# Altium footprint library MyPcbLib.PcbLib: 657 footprints (part 31 of 42)
Each footprint in its own frame and in the unit in brackets; x right, y up, seen from the top. Pads: shape width x height; smd on the part's side, far side on the other; paste and mask are expansions set on the pad; w line width, h text height; cw(c..) or ccw(c..) is an arc to the next point about the centre after c.
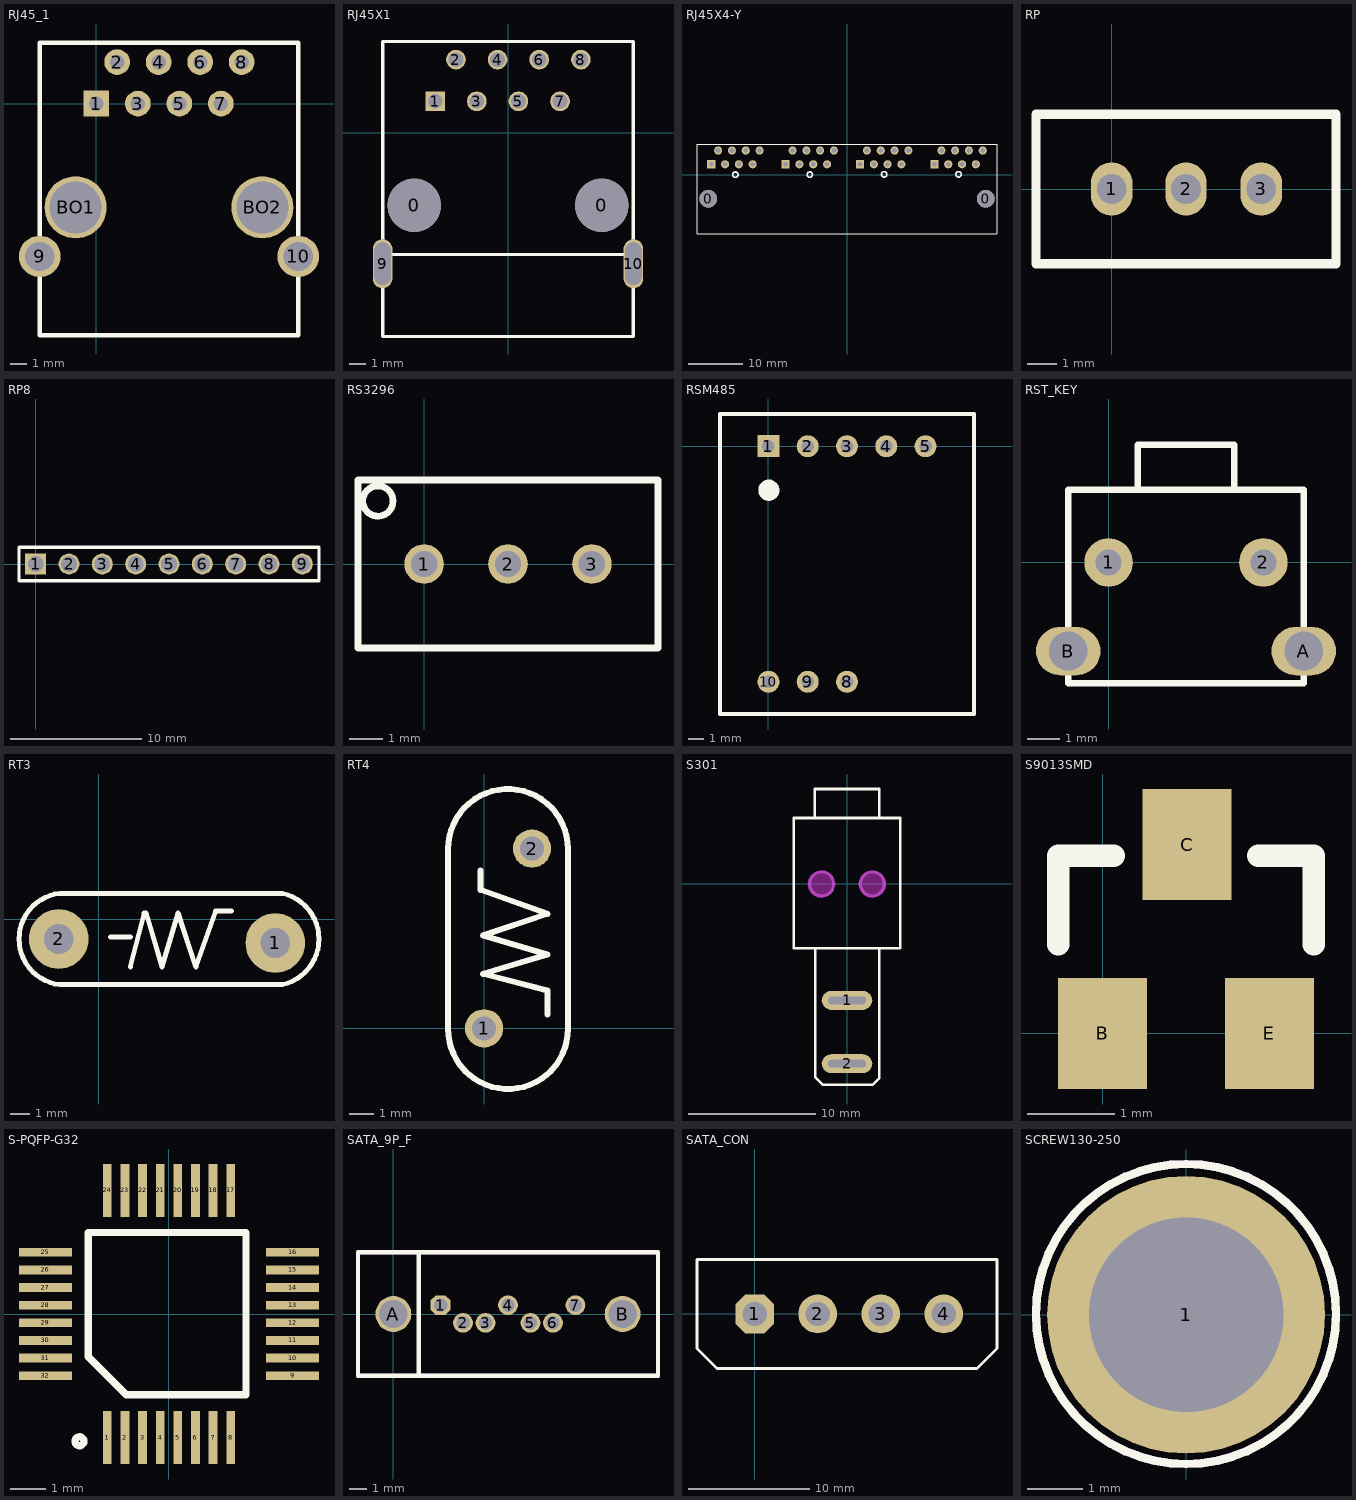
[diagram p30: the footprints below, top view; thin cyan lines are the x and y axes]

## RJ45_1 [mil]
pads (12):
  rect 62x62 hole 35: 1(0,0)
  round 62 hole 35: 2(50,100) 3(100,0) 4(150,100) 5(200,0) 6(250,100) 7(300,0) 8(350,100)
  round 100 hole 70: 9(-136.42,-368.11) 10(486.42,-368.11)
  round 150 hole 125: BO1(-50,-250) BO2(400,-250)
Top Overlay:
  lines w10: -136.42,-558.33 -136.42,146.67 486.42,146.67 486.42,-558.33 -136.42,-558.33

## RJ45X1 [mm]
pads (12):
  round 3.25 hole 3.25: 0(-5.715,-4.445) 0(5.715,-4.445)
  rect 1.2x1.2 hole 0.9: 1(-4.445,1.905)
  round 1.2 hole 0.9: 2(-3.175,4.445) 3(-1.905,1.905) 4(-0.635,4.445) 5(0.635,1.905) 6(1.905,4.445) 7(3.175,1.905) 8(4.445,4.445)
  oval 1.2x3 hole 1 slot 2.6 at 90 deg: 9(-7.65,-8) 10(7.65,-8)
Top Overlay:
  lines w0.203: -7.65,-7.445 7.65,-7.445 ; -7.65,-12.446 -7.65,5.555 7.65,5.555 7.65,-12.446 -7.65,-12.446
3D body: height 13.98, standoff -3.68, extent -7.649,-12.612 7.751,6.058

## RJ45X4-Y [mm]
pads (34):
  round 3.25 hole 3.25: 0(-25.55,-4.445) 0(25.55,-4.445)
  rect 1.5x1.5 hole 0.9: 11(-24.995,1.905) 21(-11.295,1.905) 31(2.405,1.905) 41(16.105,1.905)
  round 1.5 hole 0.9: 12(-23.725,4.445) 13(-22.455,1.905) 14(-21.185,4.445) 15(-19.915,1.905) 16(-18.645,4.445) 17(-17.375,1.905) 18(-16.105,4.445) 22(-10.025,4.445) 23(-8.755,1.905) 24(-7.485,4.445) 25(-6.215,1.905) 26(-4.945,4.445) 27(-3.675,1.905) 28(-2.405,4.445) 32(3.675,4.445) 33(4.945,1.905) 34(6.215,4.445) 35(7.485,1.905) 36(8.755,4.445) 37(10.025,1.905) 38(11.295,4.445) 42(17.375,4.445) 43(18.645,1.905) 44(19.915,4.445) 45(21.185,1.905) 46(22.455,4.445) 47(23.725,1.905) 48(24.995,4.445)
Top Overlay:
  circle w0.254: c20.55,0.051 r0.5
  circle w0.254: c6.85,0.051 r0.5
  circle w0.254: c-6.85,0 r0.5
  circle w0.254: c-20.55,0 r0.5
  lines w0.203: 27.574,-10.845 -27.625,-10.845 -27.625,5.555 27.574,5.555 ; 27.625,-10.845 27.625,5.555

## RP [mm]
pads (3):
  oval 1.4x1.8 hole 1: 1(-0.004,0.001) 2(2.504,0.001) 3(5.044,0.001)
Top Overlay:
  lines w0.305: -2.56,-2.523 7.568,-2.523 7.568,2.525 -2.56,2.525 -2.56,-2.523

## RP8 [mm]
height 1.5
pads (9):
  rect 1.6x1.6 hole 1.2: 1(0,0)
  round 1.6 hole 1.2: 2(2.54,0) 3(5.08,0) 4(7.62,0) 5(10.16,0) 6(12.7,0) 7(15.24,0) 8(17.78,0) 9(20.32,0)
Top Overlay:
  lines w0.254: -1.27,-1.27 21.59,-1.27 21.59,1.27 -1.27,1.27 -1.27,-1.27
3D body: height 2.5, standoff -7.46, extent -1.27,-2.612 21.59,2.388

## RS3296 [mm]
pads (3):
  round 1.2 hole 0.8: 1(0,0) 2(2.54,0) 3(5.08,0)
Top Overlay:
  circle w0.203: c-1.397,1.905 r0.458
  lines w0.203: -2,-2.54 -2,2.54 7.08,2.54 7.08,-2.54 -2,-2.54

## RSM485 [mil]
pads (8):
  rect 56x56 hole 32: 1(0,0)
  round 56 hole 32: 2(100,0) 3(200,0) 4(300,0) 5(400,0) 8(200,-600) 9(100,-600) 10(0,-600)
Top Overlay:
  circle w30: c1,-112 r12
  lines w10: -123,-682 523,-682 523,82 -123,82 -123,-682

## RST_KEY [mm]
pads (4):
  round 1.5 hole 0.8: 1(-0.01,-0.01) 2(4.79,-0.01)
  oval 2x1.5 hole 1.2: A(6.04,-2.76) B(-1.26,-2.76)
Top Overlay:
  lines w0.2: 0.89,2.24 0.89,3.64 3.89,3.64 3.89,2.24 ; -1.26,-3.76 -1.26,2.24 6.04,2.24 6.04,-3.76 -1.26,-3.76

## RT3 [mm]
pads (2):
  round 3 hole 1.5: 1(8.9,-1.2) 2(-2,-1)
Top Overlay:
  lines w0.25: 0.6,-0.9 1.6,-0.9 ; 1.6,-2.4 2.3,0.3 ; 2.4,0.3 3.2,-2.4 4,0.3 4.9,-2.4 5.9,0.4 6.7,0.4 ; 9.25,-3.3 -1.95,-3.3 cw(c-1.687,-1) -1.949,1.3 9.25,1.3 ; 9.251,-3.3 ccw(c8.745,-1) 9.251,1.3

## RT4 [mm]
pads (2):
  round 1.6 hole 1: 1(0,0) 2(2,7.5)
Top Overlay:
  lines w0.25: -1.501,-0.017 -1.501,7.483 cw(c0.999,7.483) 3.499,7.483 3.499,-0.017 ; -1.501,-0.009 ccw(c0.999,-0.03) 3.499,-0.009 ; -0.15,6.575 -0.15,5.775 2.65,4.775 -0.05,3.875 2.65,3.075 -0.05,2.275 2.65,1.575 2.65,0.575

## S301 [mm]
pads (2):
  oval 4x1.5 hole 0.6 slot 3 at 0 deg: 1(0,-9.2) 2(0,-14.2)
Top Overlay:
  lines w0.203: -2.54,5.207 -2.54,7.493 2.54,7.493 2.54,5.207 ; -2.5,-5.207 -2.5,-15.28 -1.905,-15.875 2.032,-15.875 2.54,-15.367 2.54,-5.207 ; -4.191,-5.1 4.191,-5.1 4.191,5.2 -4.191,5.2 -4.191,-5.1
Keep-Out Layer:
  circle w0.254: c2,-0.025 r0.95
  circle w0.254: c-2.039,-0.025 r0.95
  board cut-out: -2,-0.958 -2.248,-0.926 -2.479,-0.83 -2.678,-0.678 -2.83,-0.479 -2.926,-0.248 -2.958,0 -2.926,0.248 -2.83,0.479 -2.678,0.678 -2.479,0.83 -2.248,0.926 -2,0.958 -1.752,0.926 -1.521,0.83 -1.322,0.678 -1.17,0.479 -1.074,0.248 -1.042,0 -1.074,-0.248 -1.17,-0.479 -1.322,-0.678 -1.521,-0.83 -1.752,-0.926
  board cut-out: 1.042,0 1.074,-0.248 1.17,-0.479 1.322,-0.678 1.521,-0.83 1.752,-0.926 2,-0.958 2.248,-0.926 2.479,-0.83 2.678,-0.678 2.83,-0.479 2.926,-0.248 2.958,0 2.926,0.248 2.83,0.479 2.678,0.678 2.479,0.83 2.248,0.926 2,0.958 1.752,0.926 1.521,0.83 1.322,0.678 1.17,0.479 1.074,0.248
Mechanical 1:
  circle w0.254: c2,0 r0.95
  circle w0.254: c-2,0 r0.95
3D body: height 13.3, standoff -2, extent -4.199,-5.15 4.301,7.35

## S9013SMD [mil]
pads (3):
  rect 40x50 smd: B(-0.02,-0.16) C(37.98,84.84) E(74.98,-0.16)
Top Overlay:
  lines w10: -20.02,39.84 -20.02,79.84 4.98,79.84 ; 69.98,79.84 94.98,79.84 94.98,39.84

## S-PQFP-G32 [mm]
pads (32):
  rect 0.25x1.5 smd: 1(-1.75,-3.5) 2(-1.25,-3.5) 3(-0.75,-3.5) 4(-0.25,-3.5) 5(0.25,-3.5) 6(0.75,-3.5) 7(1.25,-3.5) 8(1.75,-3.5) 17(1.75,3.5) 18(1.25,3.5) 19(0.75,3.5) 20(0.25,3.5) 21(-0.25,3.5) 22(-0.75,3.5) 23(-1.25,3.5) 24(-1.75,3.5)
  rect 1.5x0.25 smd: 9(3.5,-1.75) 10(3.5,-1.25) 11(3.5,-0.75) 12(3.5,-0.25) 13(3.5,0.25) 14(3.5,0.75) 15(3.5,1.25) 16(3.5,1.75) 25(-3.5,1.75) 26(-3.5,1.25) 27(-3.5,0.75) 28(-3.5,0.25) 29(-3.5,-0.25) 30(-3.5,-0.75) 31(-3.5,-1.25) 32(-3.5,-1.75)
Top Overlay:
  circle w0.203: c-2.536,-3.607 r0.127
  lines w0.203: -2.286,-1.214 -1.214,-2.286 2.184,-2.286 2.184,2.311 -2.286,2.311 -2.286,-1.214

## SATA_9P_F [mil]
pads (9):
  oct 44x44 hole 30: 1(105,19.68)
  round 44 hole 30: 2(155,-19.68) 3(205,-19.68) 4(255,19.68) 5(305,-19.68) 6(355,-19.68) 7(405,19.68)
  round 80 hole 63: A(0,0) B(510,0)
Top Overlay:
  lines w10: 56,-136.8 56,137.8 ; -78.74,-137.8 -78.74,137.8 588.74,137.8 588.74,-137.8 -78.74,-137.8
Mechanical 1:
  lines w10: -78.74,-137.8 -78.74,137.8 588.74,137.8 588.74,-137.8 -78.74,-137.8

## SATA_CON [mm]
pads (4):
  oct 3.2x3.2 hole 2: 1(0,0)
  round 3.2 hole 2: 2(5.2,0) 3(10.4,0) 4(15.6,0)
Top Overlay:
  lines w0.254: 18.335,-4.504 4.385,-4.506 -3.107,-4.502 -4.76,-2.849 -4.76,4.5 20,4.5 20,-2.849 18.347,-4.502
3D body: height 11.2, standoff -2.8, extent -4.38,-4.039 19.62,3.961

## SCREW130-250 [mm]
pads (1):
  round 5 hole 3.5: 1(0,0)
Top Overlay:
  circle w0.152: c-0.001,0.012 r2.7
Mechanical 1:
  circle w0.152: c-0.001,0.012 r2.7